# Altium integrated library Weidmueller_OMNIMATE_Signal.IntLib: 2550 symbols (part 5 of 45) (continued)
## 1037010000_Single (continued)

## 1037020000
designator J?
OMNIMATE Signal - series BC/SC 3.81; PartNumber: 1037020000; Manufacturer: Weidmueller; Short_text_for_material: SC-SMT 3.81/04/270F 3.2SN BK BX; Side_termination_characteristic: Flange; Mounting_onto_the_PCB: Reflow solder connection; Pitch_mm: 3.81 mm; Pitch_inch: 0.15 inch; No_of_poles: 4; Outgoing_elbow: 270°; Solder_pin_length_mm: 3.2 mm; Contact_material: Cu-Leg; Contact_surface: tinned; Insulating_material: LCP GF; UL_94_flammability_rating: V-0; Rated_voltage_for_surge_voltage_class_pollution_degree_II_2: 320 V; Rated_voltage_use_group_B_UL_1059: 300 V; Rated_current_use_group_B_UL_1059: 10 A; PackageReference: SC_SMT_3_81_270F_04; Colour: Black; Packaging: Box; Qty: 50 PCS; Revision: V1; ComponentLink1Description: Manufacturer URL; ComponentLink1URL: http://www.weidmueller.com/; ComponentLink2Description: URL Link1; ComponentLink2URL: http://catalog.weidmueller.com/catalog/Start.do?localeId=en&ObjectID=1037020000
footprint SC_SMT_3_81_270F_04 (OMNIMATE Signal - Serie BC/SC 3.81  SC-SMT 3.81/04/270F 3.2)
pins: A1, A2, A3, A4

## 1037020000_Single
designator J?
OMNIMATE Signal - series BC/SC 3.81; PartNumber: 1037020000; Manufacturer: Weidmueller; Short_text_for_material: SC-SMT 3.81/04/270F 3.2SN BK BX; Side_termination_characteristic: Flange; Mounting_onto_the_PCB: Reflow solder connection; Pitch_mm: 3.81 mm; Pitch_inch: 0.15 inch; No_of_poles: 4; Outgoing_elbow: 270°; Solder_pin_length_mm: 3.2 mm; Contact_material: Cu-Leg; Contact_surface: tinned; Insulating_material: LCP GF; UL_94_flammability_rating: V-0; Rated_voltage_for_surge_voltage_class_pollution_degree_II_2: 320 V; Rated_voltage_use_group_B_UL_1059: 300 V; Rated_current_use_group_B_UL_1059: 10 A; PackageReference: SC_SMT_3_81_270F_04; Colour: Black; Packaging: Box; Qty: 50 PCS; Revision: V1; ComponentLink1Description: Manufacturer URL; ComponentLink1URL: http://www.weidmueller.com/; ComponentLink2Description: URL Link1; ComponentLink2URL: http://catalog.weidmueller.com/catalog/Start.do?localeId=en&ObjectID=1037020000
footprint SC_SMT_3_81_270F_04 (OMNIMATE Signal - Serie BC/SC 3.81  SC-SMT 3.81/04/270F 3.2)
part A pins: A1
part B pins: A2
part C pins: A3
part D pins: A4

## 1037060000
designator J?
OMNIMATE Signal - series BC/SC 3.81; PartNumber: 1037060000; Manufacturer: Weidmueller; Short_text_for_material: SC-SMT 3.81/08/270F 3.2SN BK BX; Side_termination_characteristic: Flange; Mounting_onto_the_PCB: Reflow solder connection; Pitch_mm: 3.81 mm; Pitch_inch: 0.15 inch; No_of_poles: 8; Outgoing_elbow: 270°; Solder_pin_length_mm: 3.2 mm; Contact_material: Cu-Leg; Contact_surface: tinned; Insulating_material: LCP GF; UL_94_flammability_rating: V-0; Rated_voltage_for_surge_voltage_class_pollution_degree_II_2: 320 V; Rated_voltage_use_group_B_UL_1059: 300 V; Rated_current_use_group_B_UL_1059: 10 A; PackageReference: SC_SMT_3_81_270F_08; Colour: Black; Packaging: Box; Qty: 50 PCS; Revision: V1; ComponentLink1Description: Manufacturer URL; ComponentLink1URL: http://www.weidmueller.com/; ComponentLink2Description: URL Link1; ComponentLink2URL: http://catalog.weidmueller.com/catalog/Start.do?localeId=en&ObjectID=1037060000
footprint SC_SMT_3_81_270F_08 (OMNIMATE Signal - Serie BC/SC 3.81  SC-SMT 3.81/08/270F 3.2)
pins: A1, A2, A3, A4, A5, A6, A7, A8

## 1037060000_Single
designator J?
OMNIMATE Signal - series BC/SC 3.81; PartNumber: 1037060000; Manufacturer: Weidmueller; Short_text_for_material: SC-SMT 3.81/08/270F 3.2SN BK BX; Side_termination_characteristic: Flange; Mounting_onto_the_PCB: Reflow solder connection; Pitch_mm: 3.81 mm; Pitch_inch: 0.15 inch; No_of_poles: 8; Outgoing_elbow: 270°; Solder_pin_length_mm: 3.2 mm; Contact_material: Cu-Leg; Contact_surface: tinned; Insulating_material: LCP GF; UL_94_flammability_rating: V-0; Rated_voltage_for_surge_voltage_class_pollution_degree_II_2: 320 V; Rated_voltage_use_group_B_UL_1059: 300 V; Rated_current_use_group_B_UL_1059: 10 A; PackageReference: SC_SMT_3_81_270F_08; Colour: Black; Packaging: Box; Qty: 50 PCS; Revision: V1; ComponentLink1Description: Manufacturer URL; ComponentLink1URL: http://www.weidmueller.com/; ComponentLink2Description: URL Link1; ComponentLink2URL: http://catalog.weidmueller.com/catalog/Start.do?localeId=en&ObjectID=1037060000
footprint SC_SMT_3_81_270F_08 (OMNIMATE Signal - Serie BC/SC 3.81  SC-SMT 3.81/08/270F 3.2)
part A pins: A1
part B pins: A2
part C pins: A3
part D pins: A4
part E pins: A5
part F pins: A6
part G pins: A7
part H pins: A8

## 1037330000
designator J?
OMNIMATE Signal - series BC/SC 3.81; PartNumber: 1037330000; Manufacturer: Weidmueller; Short_text_for_material: SC-SMT 3.81/02/270F 1.5SN BK BX; Side_termination_characteristic: Flange; Mounting_onto_the_PCB: Reflow solder connection; Pitch_mm: 3.81 mm; Pitch_inch: 0.15 inch; No_of_poles: 2; Outgoing_elbow: 270°; Solder_pin_length_mm: 1.5 mm; Contact_surface: tinned; Insulating_material: LCP GF; UL_94_flammability_rating: V-0; Rated_voltage_for_surge_voltage_class_pollution_degree_II_2: 320 V; Rated_current_min_no_of_poles_TU_20_deg_C: 17.5 A; Rated_voltage_use_group_B_UL_1059: 300 V; Rated_current_use_group_B_UL_1059: 10 A; PackageReference: SC_SMT_3_81_270F_02; Colour: Black; Packaging: Box; Qty: 50 PCS; Revision: V1; ComponentLink1Description: Manufacturer URL; ComponentLink1URL: http://www.weidmueller.com/; ComponentLink2Description: URL Link1; ComponentLink2URL: http://catalog.weidmueller.com/catalog/Start.do?localeId=en&ObjectID=1037330000
footprint SC_SMT_3_81_270F_02 (OMNIMATE Signal - Serie BC/SC 3.81  SC-SMT 3.81/02/270F 3.2)
pins: A1, A2

## 1037330000_Single
designator J?
OMNIMATE Signal - series BC/SC 3.81; PartNumber: 1037330000; Manufacturer: Weidmueller; Short_text_for_material: SC-SMT 3.81/02/270F 1.5SN BK BX; Side_termination_characteristic: Flange; Mounting_onto_the_PCB: Reflow solder connection; Pitch_mm: 3.81 mm; Pitch_inch: 0.15 inch; No_of_poles: 2; Outgoing_elbow: 270°; Solder_pin_length_mm: 1.5 mm; Contact_surface: tinned; Insulating_material: LCP GF; UL_94_flammability_rating: V-0; Rated_voltage_for_surge_voltage_class_pollution_degree_II_2: 320 V; Rated_current_min_no_of_poles_TU_20_deg_C: 17.5 A; Rated_voltage_use_group_B_UL_1059: 300 V; Rated_current_use_group_B_UL_1059: 10 A; PackageReference: SC_SMT_3_81_270F_02; Colour: Black; Packaging: Box; Qty: 50 PCS; Revision: V1; ComponentLink1Description: Manufacturer URL; ComponentLink1URL: http://www.weidmueller.com/; ComponentLink2Description: URL Link1; ComponentLink2URL: http://catalog.weidmueller.com/catalog/Start.do?localeId=en&ObjectID=1037330000
footprint SC_SMT_3_81_270F_02 (OMNIMATE Signal - Serie BC/SC 3.81  SC-SMT 3.81/02/270F 3.2)
part A pins: A1
part B pins: A2

## 1037340000
designator J?
OMNIMATE Signal - series BC/SC 3.81; PartNumber: 1037340000; Manufacturer: Weidmueller; Short_text_for_material: SC-SMT 3.81/03/270F 1.5SN BK BX; Side_termination_characteristic: Flange; Mounting_onto_the_PCB: Reflow solder connection; Pitch_mm: 3.81 mm; Pitch_inch: 0.15 inch; No_of_poles: 3; Outgoing_elbow: 270°; Solder_pin_length_mm: 1.5 mm; Contact_surface: tinned; Insulating_material: LCP GF; UL_94_flammability_rating: V-0; Rated_voltage_for_surge_voltage_class_pollution_degree_II_2: 320 V; Rated_current_min_no_of_poles_TU_20_deg_C: 17.5 A; Rated_voltage_use_group_B_UL_1059: 300 V; Rated_current_use_group_B_UL_1059: 10 A; PackageReference: SC_SMT_3_81_270F_03; Colour: Black; Packaging: Box; Qty: 50 PCS; Revision: V1; ComponentLink1Description: Manufacturer URL; ComponentLink1URL: http://www.weidmueller.com/; ComponentLink2Description: URL Link1; ComponentLink2URL: http://catalog.weidmueller.com/catalog/Start.do?localeId=en&ObjectID=1037340000
footprint SC_SMT_3_81_270F_03 (OMNIMATE Signal - Serie BC/SC 3.81  SC-SMT 3.81/03/270F 3.2)
pins: A1, A2, A3

## 1037340000_Single
designator J?
OMNIMATE Signal - series BC/SC 3.81; PartNumber: 1037340000; Manufacturer: Weidmueller; Short_text_for_material: SC-SMT 3.81/03/270F 1.5SN BK BX; Side_termination_characteristic: Flange; Mounting_onto_the_PCB: Reflow solder connection; Pitch_mm: 3.81 mm; Pitch_inch: 0.15 inch; No_of_poles: 3; Outgoing_elbow: 270°; Solder_pin_length_mm: 1.5 mm; Contact_surface: tinned; Insulating_material: LCP GF; UL_94_flammability_rating: V-0; Rated_voltage_for_surge_voltage_class_pollution_degree_II_2: 320 V; Rated_current_min_no_of_poles_TU_20_deg_C: 17.5 A; Rated_voltage_use_group_B_UL_1059: 300 V; Rated_current_use_group_B_UL_1059: 10 A; PackageReference: SC_SMT_3_81_270F_03; Colour: Black; Packaging: Box; Qty: 50 PCS; Revision: V1; ComponentLink1Description: Manufacturer URL; ComponentLink1URL: http://www.weidmueller.com/; ComponentLink2Description: URL Link1; ComponentLink2URL: http://catalog.weidmueller.com/catalog/Start.do?localeId=en&ObjectID=1037340000
footprint SC_SMT_3_81_270F_03 (OMNIMATE Signal - Serie BC/SC 3.81  SC-SMT 3.81/03/270F 3.2)
part A pins: A1
part B pins: A2
part C pins: A3

## 1037350000
designator J?
OMNIMATE Signal - series BC/SC 3.81; PartNumber: 1037350000; Manufacturer: Weidmueller; Short_text_for_material: SC-SMT 3.81/04/270F 1.5SN BK BX; Side_termination_characteristic: Flange; Mounting_onto_the_PCB: Reflow solder connection; Pitch_mm: 3.81 mm; Pitch_inch: 0.15 inch; No_of_poles: 4; Outgoing_elbow: 270°; Solder_pin_length_mm: 1.5 mm; Contact_surface: tinned; Insulating_material: LCP GF; UL_94_flammability_rating: V-0; Rated_voltage_for_surge_voltage_class_pollution_degree_II_2: 320 V; Rated_current_min_no_of_poles_TU_20_deg_C: 17.5 A; Rated_voltage_use_group_B_UL_1059: 300 V; Rated_current_use_group_B_UL_1059: 10 A; PackageReference: SC_SMT_3_81_270F_04; Colour: Black; Packaging: Box; Qty: 50 PCS; Revision: V1; ComponentLink1Description: Manufacturer URL; ComponentLink1URL: http://www.weidmueller.com/; ComponentLink2Description: URL Link1; ComponentLink2URL: http://catalog.weidmueller.com/catalog/Start.do?localeId=en&ObjectID=1037350000
footprint SC_SMT_3_81_270F_04 (OMNIMATE Signal - Serie BC/SC 3.81  SC-SMT 3.81/04/270F 3.2)
pins: A1, A2, A3, A4

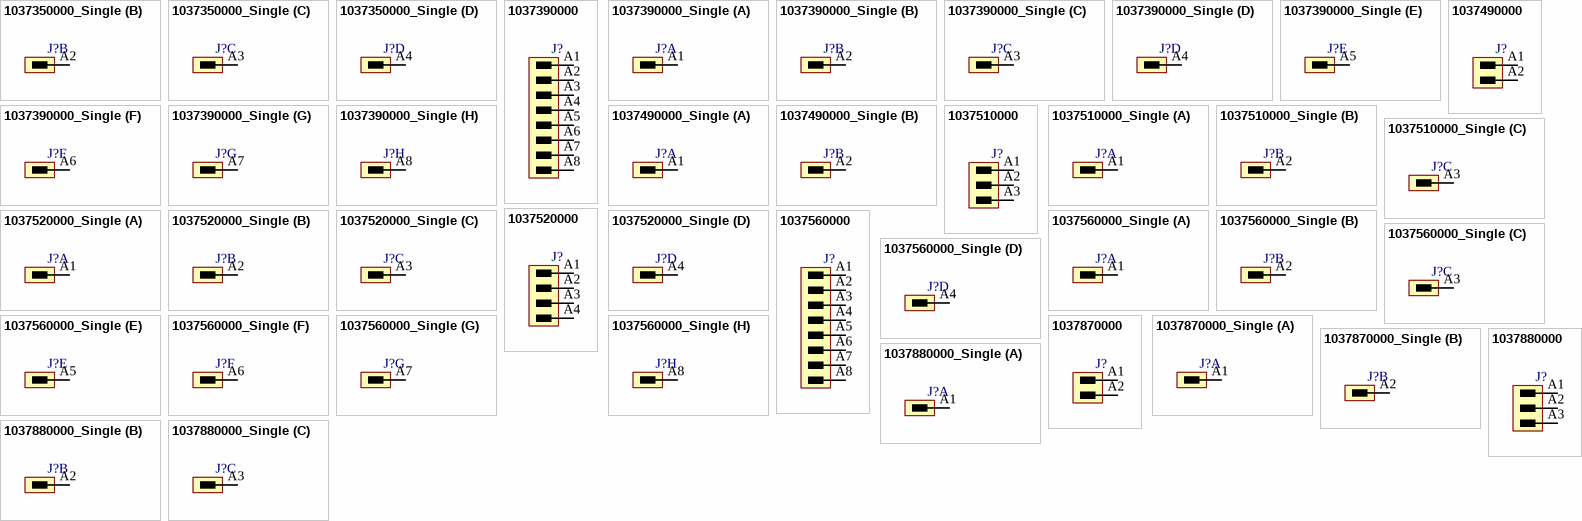
[diagram p30: symbols 1037350000_Single to 1037880000_Single]

## 1037350000_Single
designator J?
OMNIMATE Signal - series BC/SC 3.81; PartNumber: 1037350000; Manufacturer: Weidmueller; Short_text_for_material: SC-SMT 3.81/04/270F 1.5SN BK BX; Side_termination_characteristic: Flange; Mounting_onto_the_PCB: Reflow solder connection; Pitch_mm: 3.81 mm; Pitch_inch: 0.15 inch; No_of_poles: 4; Outgoing_elbow: 270°; Solder_pin_length_mm: 1.5 mm; Contact_surface: tinned; Insulating_material: LCP GF; UL_94_flammability_rating: V-0; Rated_voltage_for_surge_voltage_class_pollution_degree_II_2: 320 V; Rated_current_min_no_of_poles_TU_20_deg_C: 17.5 A; Rated_voltage_use_group_B_UL_1059: 300 V; Rated_current_use_group_B_UL_1059: 10 A; PackageReference: SC_SMT_3_81_270F_04; Colour: Black; Packaging: Box; Qty: 50 PCS; Revision: V1; ComponentLink1Description: Manufacturer URL; ComponentLink1URL: http://www.weidmueller.com/; ComponentLink2Description: URL Link1; ComponentLink2URL: http://catalog.weidmueller.com/catalog/Start.do?localeId=en&ObjectID=1037350000
footprint SC_SMT_3_81_270F_04 (OMNIMATE Signal - Serie BC/SC 3.81  SC-SMT 3.81/04/270F 3.2)
part A pins: A1
part B pins: A2
part C pins: A3
part D pins: A4

## 1037390000
designator J?
OMNIMATE Signal - series BC/SC 3.81; PartNumber: 1037390000; Manufacturer: Weidmueller; Short_text_for_material: SC-SMT 3.81/08/270F 1.5SN BK BX; Side_termination_characteristic: Flange; Mounting_onto_the_PCB: Reflow solder connection; Pitch_mm: 3.81 mm; Pitch_inch: 0.15 inch; No_of_poles: 8; Outgoing_elbow: 270°; Solder_pin_length_mm: 1.5 mm; Contact_surface: tinned; Insulating_material: LCP GF; UL_94_flammability_rating: V-0; Rated_voltage_for_surge_voltage_class_pollution_degree_II_2: 320 V; Rated_current_min_no_of_poles_TU_20_deg_C: 17.5 A; Rated_voltage_use_group_B_UL_1059: 300 V; Rated_current_use_group_B_UL_1059: 10 A; PackageReference: SC_SMT_3_81_270F_08; Colour: Black; Packaging: Box; Qty: 50 PCS; Revision: V1; ComponentLink1Description: Manufacturer URL; ComponentLink1URL: http://www.weidmueller.com/; ComponentLink2Description: URL Link1; ComponentLink2URL: http://catalog.weidmueller.com/catalog/Start.do?localeId=en&ObjectID=1037390000
footprint SC_SMT_3_81_270F_08 (OMNIMATE Signal - Serie BC/SC 3.81  SC-SMT 3.81/08/270F 3.2)
pins: A1, A2, A3, A4, A5, A6, A7, A8

## 1037390000_Single
designator J?
OMNIMATE Signal - series BC/SC 3.81; PartNumber: 1037390000; Manufacturer: Weidmueller; Short_text_for_material: SC-SMT 3.81/08/270F 1.5SN BK BX; Side_termination_characteristic: Flange; Mounting_onto_the_PCB: Reflow solder connection; Pitch_mm: 3.81 mm; Pitch_inch: 0.15 inch; No_of_poles: 8; Outgoing_elbow: 270°; Solder_pin_length_mm: 1.5 mm; Contact_surface: tinned; Insulating_material: LCP GF; UL_94_flammability_rating: V-0; Rated_voltage_for_surge_voltage_class_pollution_degree_II_2: 320 V; Rated_current_min_no_of_poles_TU_20_deg_C: 17.5 A; Rated_voltage_use_group_B_UL_1059: 300 V; Rated_current_use_group_B_UL_1059: 10 A; PackageReference: SC_SMT_3_81_270F_08; Colour: Black; Packaging: Box; Qty: 50 PCS; Revision: V1; ComponentLink1Description: Manufacturer URL; ComponentLink1URL: http://www.weidmueller.com/; ComponentLink2Description: URL Link1; ComponentLink2URL: http://catalog.weidmueller.com/catalog/Start.do?localeId=en&ObjectID=1037390000
footprint SC_SMT_3_81_270F_08 (OMNIMATE Signal - Serie BC/SC 3.81  SC-SMT 3.81/08/270F 3.2)
part A pins: A1
part B pins: A2
part C pins: A3
part D pins: A4
part E pins: A5
part F pins: A6
part G pins: A7
part H pins: A8

## 1037490000
designator J?
OMNIMATE Signal - series BC/SC 3.81; PartNumber: 1037490000; Manufacturer: Weidmueller; Short_text_for_material: SC 3.81/02/270G 3.2SN OR BX; Side_termination_characteristic: closed side; Mounting_onto_the_PCB: Solder connection; Pitch_mm: 3.81 mm; Pitch_inch: 0.15 inch; No_of_poles: 2; Outgoing_elbow: 270°; Solder_pin_length_mm: 3.2 mm; Contact_material: Cu-Leg; Contact_surface: tinned; Insulating_material: PA GF; UL_94_flammability_rating: V-0; Rated_voltage_for_surge_voltage_class_pollution_degree_II_2: 320 V; Rated_voltage_use_group_B_UL_1059: 300 V; Rated_current_use_group_B_UL_1059: 10 A; PackageReference: SC_3_81_270G_02; Colour: Orange; Packaging: Box; Qty: 50 PCS; Revision: V1; ComponentLink1Description: Manufacturer URL; ComponentLink1URL: http://www.weidmueller.com/; ComponentLink2Description: URL Link1; ComponentLink2URL: http://catalog.weidmueller.com/catalog/Start.do?localeId=en&ObjectID=1037490000
footprint SC_3_81_270G_02 (OMNIMATE Signal - Serie BC/SC 3.81  SC 3.81/02/270G 3.2)
pins: A1, A2

## 1037490000_Single
designator J?
OMNIMATE Signal - series BC/SC 3.81; PartNumber: 1037490000; Manufacturer: Weidmueller; Short_text_for_material: SC 3.81/02/270G 3.2SN OR BX; Side_termination_characteristic: closed side; Mounting_onto_the_PCB: Solder connection; Pitch_mm: 3.81 mm; Pitch_inch: 0.15 inch; No_of_poles: 2; Outgoing_elbow: 270°; Solder_pin_length_mm: 3.2 mm; Contact_material: Cu-Leg; Contact_surface: tinned; Insulating_material: PA GF; UL_94_flammability_rating: V-0; Rated_voltage_for_surge_voltage_class_pollution_degree_II_2: 320 V; Rated_voltage_use_group_B_UL_1059: 300 V; Rated_current_use_group_B_UL_1059: 10 A; PackageReference: SC_3_81_270G_02; Colour: Orange; Packaging: Box; Qty: 50 PCS; Revision: V1; ComponentLink1Description: Manufacturer URL; ComponentLink1URL: http://www.weidmueller.com/; ComponentLink2Description: URL Link1; ComponentLink2URL: http://catalog.weidmueller.com/catalog/Start.do?localeId=en&ObjectID=1037490000
footprint SC_3_81_270G_02 (OMNIMATE Signal - Serie BC/SC 3.81  SC 3.81/02/270G 3.2)
part A pins: A1
part B pins: A2

## 1037510000
designator J?
OMNIMATE Signal - series BC/SC 3.81; PartNumber: 1037510000; Manufacturer: Weidmueller; Short_text_for_material: SC 3.81/03/270G 3.2SN OR BX; Side_termination_characteristic: closed side; Mounting_onto_the_PCB: Solder connection; Pitch_mm: 3.81 mm; Pitch_inch: 0.15 inch; No_of_poles: 3; Outgoing_elbow: 270°; Solder_pin_length_mm: 3.2 mm; Contact_material: Cu-Leg; Contact_surface: tinned; Insulating_material: PA GF; UL_94_flammability_rating: V-0; Rated_voltage_for_surge_voltage_class_pollution_degree_II_2: 320 V; Rated_voltage_use_group_B_UL_1059: 300 V; Rated_current_use_group_B_UL_1059: 10 A; PackageReference: SC_3_81_270G_03; Colour: Orange; Packaging: Box; Qty: 50 PCS; Revision: V1; ComponentLink1Description: Manufacturer URL; ComponentLink1URL: http://www.weidmueller.com/; ComponentLink2Description: URL Link1; ComponentLink2URL: http://catalog.weidmueller.com/catalog/Start.do?localeId=en&ObjectID=1037510000
footprint SC_3_81_270G_03 (OMNIMATE Signal - Serie BC/SC 3.81  SC 3.81/03/270G 3.2)
pins: A1, A2, A3

## 1037510000_Single
designator J?
OMNIMATE Signal - series BC/SC 3.81; PartNumber: 1037510000; Manufacturer: Weidmueller; Short_text_for_material: SC 3.81/03/270G 3.2SN OR BX; Side_termination_characteristic: closed side; Mounting_onto_the_PCB: Solder connection; Pitch_mm: 3.81 mm; Pitch_inch: 0.15 inch; No_of_poles: 3; Outgoing_elbow: 270°; Solder_pin_length_mm: 3.2 mm; Contact_material: Cu-Leg; Contact_surface: tinned; Insulating_material: PA GF; UL_94_flammability_rating: V-0; Rated_voltage_for_surge_voltage_class_pollution_degree_II_2: 320 V; Rated_voltage_use_group_B_UL_1059: 300 V; Rated_current_use_group_B_UL_1059: 10 A; PackageReference: SC_3_81_270G_03; Colour: Orange; Packaging: Box; Qty: 50 PCS; Revision: V1; ComponentLink1Description: Manufacturer URL; ComponentLink1URL: http://www.weidmueller.com/; ComponentLink2Description: URL Link1; ComponentLink2URL: http://catalog.weidmueller.com/catalog/Start.do?localeId=en&ObjectID=1037510000
footprint SC_3_81_270G_03 (OMNIMATE Signal - Serie BC/SC 3.81  SC 3.81/03/270G 3.2)
part A pins: A1
part B pins: A2
part C pins: A3

## 1037520000
designator J?
OMNIMATE Signal - series BC/SC 3.81; PartNumber: 1037520000; Manufacturer: Weidmueller; Short_text_for_material: SC 3.81/04/270G 3.2SN OR BX; Side_termination_characteristic: closed side; Mounting_onto_the_PCB: Solder connection; Pitch_mm: 3.81 mm; Pitch_inch: 0.15 inch; No_of_poles: 4; Outgoing_elbow: 270°; Solder_pin_length_mm: 3.2 mm; Contact_material: Cu-Leg; Contact_surface: tinned; Insulating_material: PA GF; UL_94_flammability_rating: V-0; Rated_voltage_for_surge_voltage_class_pollution_degree_II_2: 320 V; Rated_voltage_use_group_B_UL_1059: 300 V; Rated_current_use_group_B_UL_1059: 10 A; PackageReference: SC_3_81_270G_04; Colour: Orange; Packaging: Box; Qty: 50 PCS; Revision: V1; ComponentLink1Description: Manufacturer URL; ComponentLink1URL: http://www.weidmueller.com/; ComponentLink2Description: URL Link1; ComponentLink2URL: http://catalog.weidmueller.com/catalog/Start.do?localeId=en&ObjectID=1037520000
footprint SC_3_81_270G_04 (OMNIMATE Signal - Serie BC/SC 3.81  SC 3.81/04/270G 3.2)
pins: A1, A2, A3, A4

## 1037520000_Single
designator J?
OMNIMATE Signal - series BC/SC 3.81; PartNumber: 1037520000; Manufacturer: Weidmueller; Short_text_for_material: SC 3.81/04/270G 3.2SN OR BX; Side_termination_characteristic: closed side; Mounting_onto_the_PCB: Solder connection; Pitch_mm: 3.81 mm; Pitch_inch: 0.15 inch; No_of_poles: 4; Outgoing_elbow: 270°; Solder_pin_length_mm: 3.2 mm; Contact_material: Cu-Leg; Contact_surface: tinned; Insulating_material: PA GF; UL_94_flammability_rating: V-0; Rated_voltage_for_surge_voltage_class_pollution_degree_II_2: 320 V; Rated_voltage_use_group_B_UL_1059: 300 V; Rated_current_use_group_B_UL_1059: 10 A; PackageReference: SC_3_81_270G_04; Colour: Orange; Packaging: Box; Qty: 50 PCS; Revision: V1; ComponentLink1Description: Manufacturer URL; ComponentLink1URL: http://www.weidmueller.com/; ComponentLink2Description: URL Link1; ComponentLink2URL: http://catalog.weidmueller.com/catalog/Start.do?localeId=en&ObjectID=1037520000
footprint SC_3_81_270G_04 (OMNIMATE Signal - Serie BC/SC 3.81  SC 3.81/04/270G 3.2)
part A pins: A1
part B pins: A2
part C pins: A3
part D pins: A4

## 1037560000
designator J?
OMNIMATE Signal - series BC/SC 3.81; PartNumber: 1037560000; Manufacturer: Weidmueller; Short_text_for_material: SC 3.81/08/270G 3.2SN OR BX; Side_termination_characteristic: closed side; Mounting_onto_the_PCB: Solder connection; Pitch_mm: 3.81 mm; Pitch_inch: 0.15 inch; No_of_poles: 8; Outgoing_elbow: 270°; Solder_pin_length_mm: 3.2 mm; Contact_material: Cu-Leg; Contact_surface: tinned; Insulating_material: PA GF; UL_94_flammability_rating: V-0; Rated_voltage_for_surge_voltage_class_pollution_degree_II_2: 320 V; Rated_voltage_use_group_B_UL_1059: 300 V; Rated_current_use_group_B_UL_1059: 10 A; PackageReference: SC_3_81_270G_08; Colour: Orange; Packaging: Box; Qty: 50 PCS; Revision: V1; ComponentLink1Description: Manufacturer URL; ComponentLink1URL: http://www.weidmueller.com/; ComponentLink2Description: URL Link1; ComponentLink2URL: http://catalog.weidmueller.com/catalog/Start.do?localeId=en&ObjectID=1037560000
footprint SC_3_81_270G_08 (OMNIMATE Signal - Serie BC/SC 3.81  SC 3.81/08/270G 3.2)
pins: A1, A2, A3, A4, A5, A6, A7, A8

## 1037560000_Single
designator J?
OMNIMATE Signal - series BC/SC 3.81; PartNumber: 1037560000; Manufacturer: Weidmueller; Short_text_for_material: SC 3.81/08/270G 3.2SN OR BX; Side_termination_characteristic: closed side; Mounting_onto_the_PCB: Solder connection; Pitch_mm: 3.81 mm; Pitch_inch: 0.15 inch; No_of_poles: 8; Outgoing_elbow: 270°; Solder_pin_length_mm: 3.2 mm; Contact_material: Cu-Leg; Contact_surface: tinned; Insulating_material: PA GF; UL_94_flammability_rating: V-0; Rated_voltage_for_surge_voltage_class_pollution_degree_II_2: 320 V; Rated_voltage_use_group_B_UL_1059: 300 V; Rated_current_use_group_B_UL_1059: 10 A; PackageReference: SC_3_81_270G_08; Colour: Orange; Packaging: Box; Qty: 50 PCS; Revision: V1; ComponentLink1Description: Manufacturer URL; ComponentLink1URL: http://www.weidmueller.com/; ComponentLink2Description: URL Link1; ComponentLink2URL: http://catalog.weidmueller.com/catalog/Start.do?localeId=en&ObjectID=1037560000
footprint SC_3_81_270G_08 (OMNIMATE Signal - Serie BC/SC 3.81  SC 3.81/08/270G 3.2)
part A pins: A1
part B pins: A2
part C pins: A3
part D pins: A4
part E pins: A5
part F pins: A6
part G pins: A7
part H pins: A8

## 1037870000
designator J?
OMNIMATE Signal - series BC/SC 3.81; PartNumber: 1037870000; Manufacturer: Weidmueller; Short_text_for_material: SC 3.81/02/270G 3.2SN BK BX; Side_termination_characteristic: closed side; Mounting_onto_the_PCB: Solder connection; Pitch_mm: 3.81 mm; Pitch_inch: 0.15 inch; No_of_poles: 2; Outgoing_elbow: 270°; Solder_pin_length_mm: 3.2 mm; Contact_surface: tinned; Insulating_material: PA GF; UL_94_flammability_rating: V-0; Rated_voltage_for_surge_voltage_class_pollution_degree_II_2: 320 V; Rated_current_min_no_of_poles_TU_20_deg_C: 17.5 A; Rated_voltage_use_group_B_UL_1059: 300 V; Rated_current_use_group_B_UL_1059: 10 A; PackageReference: SC_3_81_270G_02; Colour: Black; Packaging: Box; Qty: 50 PCS; Revision: V1; ComponentLink1Description: Manufacturer URL; ComponentLink1URL: http://www.weidmueller.com/; ComponentLink2Description: URL Link1; ComponentLink2URL: http://catalog.weidmueller.com/catalog/Start.do?localeId=en&ObjectID=1037870000
footprint SC_3_81_270G_02 (OMNIMATE Signal - Serie BC/SC 3.81  SC 3.81/02/270G 3.2)
pins: A1, A2

## 1037870000_Single
designator J?
OMNIMATE Signal - series BC/SC 3.81; PartNumber: 1037870000; Manufacturer: Weidmueller; Short_text_for_material: SC 3.81/02/270G 3.2SN BK BX; Side_termination_characteristic: closed side; Mounting_onto_the_PCB: Solder connection; Pitch_mm: 3.81 mm; Pitch_inch: 0.15 inch; No_of_poles: 2; Outgoing_elbow: 270°; Solder_pin_length_mm: 3.2 mm; Contact_surface: tinned; Insulating_material: PA GF; UL_94_flammability_rating: V-0; Rated_voltage_for_surge_voltage_class_pollution_degree_II_2: 320 V; Rated_current_min_no_of_poles_TU_20_deg_C: 17.5 A; Rated_voltage_use_group_B_UL_1059: 300 V; Rated_current_use_group_B_UL_1059: 10 A; PackageReference: SC_3_81_270G_02; Colour: Black; Packaging: Box; Qty: 50 PCS; Revision: V1; ComponentLink1Description: Manufacturer URL; ComponentLink1URL: http://www.weidmueller.com/; ComponentLink2Description: URL Link1; ComponentLink2URL: http://catalog.weidmueller.com/catalog/Start.do?localeId=en&ObjectID=1037870000
footprint SC_3_81_270G_02 (OMNIMATE Signal - Serie BC/SC 3.81  SC 3.81/02/270G 3.2)
part A pins: A1
part B pins: A2

## 1037880000
designator J?
OMNIMATE Signal - series BC/SC 3.81; PartNumber: 1037880000; Manufacturer: Weidmueller; Short_text_for_material: SC 3.81/03/270G 3.2SN BK BX; Side_termination_characteristic: closed side; Mounting_onto_the_PCB: Solder connection; Pitch_mm: 3.81 mm; Pitch_inch: 0.15 inch; No_of_poles: 3; Outgoing_elbow: 270°; Solder_pin_length_mm: 3.2 mm; Contact_surface: tinned; Insulating_material: PA GF; UL_94_flammability_rating: V-0; Rated_voltage_for_surge_voltage_class_pollution_degree_II_2: 320 V; Rated_current_min_no_of_poles_TU_20_deg_C: 17.5 A; Rated_voltage_use_group_B_UL_1059: 300 V; Rated_current_use_group_B_UL_1059: 10 A; PackageReference: SC_3_81_270G_03; Colour: Black; Packaging: Box; Qty: 50 PCS; Revision: V1; ComponentLink1Description: Manufacturer URL; ComponentLink1URL: http://www.weidmueller.com/; ComponentLink2Description: URL Link1; ComponentLink2URL: http://catalog.weidmueller.com/catalog/Start.do?localeId=en&ObjectID=1037880000
footprint SC_3_81_270G_03 (OMNIMATE Signal - Serie BC/SC 3.81  SC 3.81/03/270G 3.2)
pins: A1, A2, A3

## 1037880000_Single
designator J?
OMNIMATE Signal - series BC/SC 3.81; PartNumber: 1037880000; Manufacturer: Weidmueller; Short_text_for_material: SC 3.81/03/270G 3.2SN BK BX; Side_termination_characteristic: closed side; Mounting_onto_the_PCB: Solder connection; Pitch_mm: 3.81 mm; Pitch_inch: 0.15 inch; No_of_poles: 3; Outgoing_elbow: 270°; Solder_pin_length_mm: 3.2 mm; Contact_surface: tinned; Insulating_material: PA GF; UL_94_flammability_rating: V-0; Rated_voltage_for_surge_voltage_class_pollution_degree_II_2: 320 V; Rated_current_min_no_of_poles_TU_20_deg_C: 17.5 A; Rated_voltage_use_group_B_UL_1059: 300 V; Rated_current_use_group_B_UL_1059: 10 A; PackageReference: SC_3_81_270G_03; Colour: Black; Packaging: Box; Qty: 50 PCS; Revision: V1; ComponentLink1Description: Manufacturer URL; ComponentLink1URL: http://www.weidmueller.com/; ComponentLink2Description: URL Link1; ComponentLink2URL: http://catalog.weidmueller.com/catalog/Start.do?localeId=en&ObjectID=1037880000
footprint SC_3_81_270G_03 (OMNIMATE Signal - Serie BC/SC 3.81  SC 3.81/03/270G 3.2)
part A pins: A1
part B pins: A2
part C pins: A3

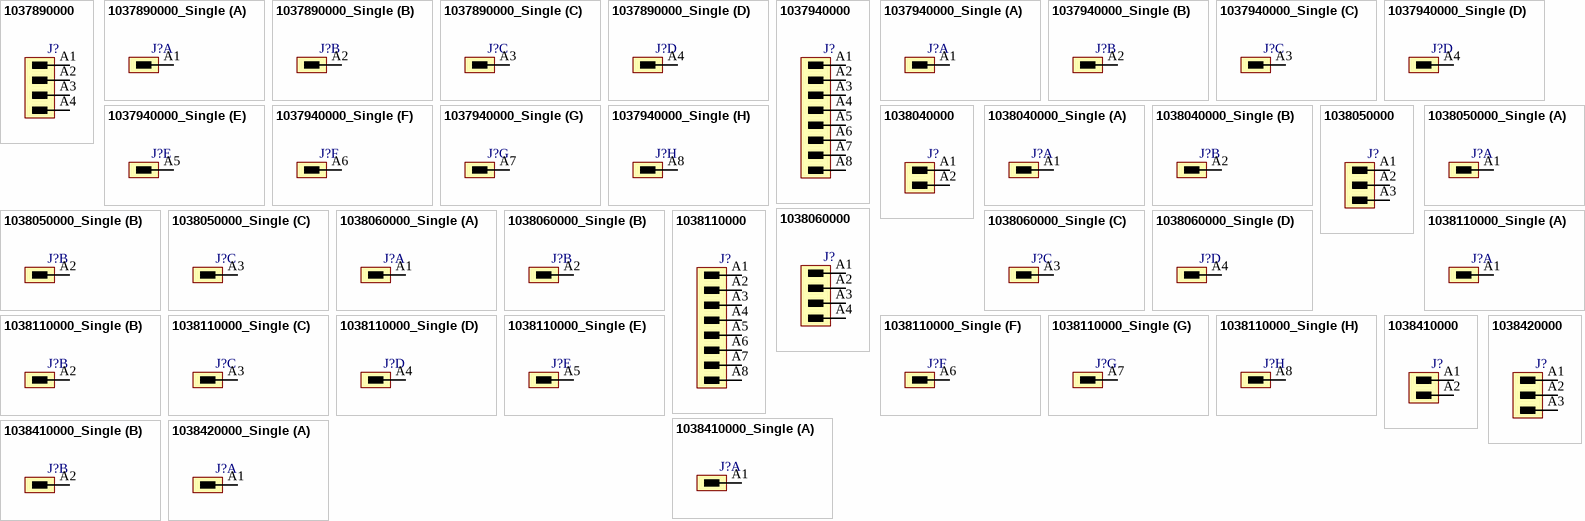
[diagram p31: symbols 1037890000 to 1038420000_Single]

## 1037890000
designator J?
OMNIMATE Signal - series BC/SC 3.81; PartNumber: 1037890000; Manufacturer: Weidmueller; Short_text_for_material: SC 3.81/04/270G 3.2SN BK BX; Side_termination_characteristic: closed side; Mounting_onto_the_PCB: Solder connection; Pitch_mm: 3.81 mm; Pitch_inch: 0.15 inch; No_of_poles: 4; Outgoing_elbow: 270°; Solder_pin_length_mm: 3.2 mm; Contact_surface: tinned; Insulating_material: PA GF; UL_94_flammability_rating: V-0; Rated_voltage_for_surge_voltage_class_pollution_degree_II_2: 320 V; Rated_current_min_no_of_poles_TU_20_deg_C: 17.5 A; Rated_voltage_use_group_B_UL_1059: 300 V; Rated_current_use_group_B_UL_1059: 10 A; PackageReference: SC_3_81_270G_04; Colour: Black; Packaging: Box; Qty: 50 PCS; Revision: V1; ComponentLink1Description: Manufacturer URL; ComponentLink1URL: http://www.weidmueller.com/; ComponentLink2Description: URL Link1; ComponentLink2URL: http://catalog.weidmueller.com/catalog/Start.do?localeId=en&ObjectID=1037890000
footprint SC_3_81_270G_04 (OMNIMATE Signal - Serie BC/SC 3.81  SC 3.81/04/270G 3.2)
pins: A1, A2, A3, A4

## 1037890000_Single
designator J?
OMNIMATE Signal - series BC/SC 3.81; PartNumber: 1037890000; Manufacturer: Weidmueller; Short_text_for_material: SC 3.81/04/270G 3.2SN BK BX; Side_termination_characteristic: closed side; Mounting_onto_the_PCB: Solder connection; Pitch_mm: 3.81 mm; Pitch_inch: 0.15 inch; No_of_poles: 4; Outgoing_elbow: 270°; Solder_pin_length_mm: 3.2 mm; Contact_surface: tinned; Insulating_material: PA GF; UL_94_flammability_rating: V-0; Rated_voltage_for_surge_voltage_class_pollution_degree_II_2: 320 V; Rated_current_min_no_of_poles_TU_20_deg_C: 17.5 A; Rated_voltage_use_group_B_UL_1059: 300 V; Rated_current_use_group_B_UL_1059: 10 A; PackageReference: SC_3_81_270G_04; Colour: Black; Packaging: Box; Qty: 50 PCS; Revision: V1; ComponentLink1Description: Manufacturer URL; ComponentLink1URL: http://www.weidmueller.com/; ComponentLink2Description: URL Link1; ComponentLink2URL: http://catalog.weidmueller.com/catalog/Start.do?localeId=en&ObjectID=1037890000
footprint SC_3_81_270G_04 (OMNIMATE Signal - Serie BC/SC 3.81  SC 3.81/04/270G 3.2)
part A pins: A1
part B pins: A2
part C pins: A3
part D pins: A4

## 1037940000
designator J?
OMNIMATE Signal - series BC/SC 3.81; PartNumber: 1037940000; Manufacturer: Weidmueller; Short_text_for_material: SC 3.81/08/270G 3.2SN BK BX; Side_termination_characteristic: closed side; Mounting_onto_the_PCB: Solder connection; Pitch_mm: 3.81 mm; Pitch_inch: 0.15 inch; No_of_poles: 8; Outgoing_elbow: 270°; Solder_pin_length_mm: 3.2 mm; Contact_surface: tinned; Insulating_material: PA GF; UL_94_flammability_rating: V-0; Rated_voltage_for_surge_voltage_class_pollution_degree_II_2: 320 V; Rated_current_min_no_of_poles_TU_20_deg_C: 17.5 A; Rated_voltage_use_group_B_UL_1059: 300 V; Rated_current_use_group_B_UL_1059: 10 A; PackageReference: SC_3_81_270G_08; Colour: Black; Packaging: Box; Qty: 50 PCS; Revision: V1; ComponentLink1Description: Manufacturer URL; ComponentLink1URL: http://www.weidmueller.com/; ComponentLink2Description: URL Link1; ComponentLink2URL: http://catalog.weidmueller.com/catalog/Start.do?localeId=en&ObjectID=1037940000
footprint SC_3_81_270G_08 (OMNIMATE Signal - Serie BC/SC 3.81  SC 3.81/08/270G 3.2)
pins: A1, A2, A3, A4, A5, A6, A7, A8

## 1037940000_Single
designator J?
OMNIMATE Signal - series BC/SC 3.81; PartNumber: 1037940000; Manufacturer: Weidmueller; Short_text_for_material: SC 3.81/08/270G 3.2SN BK BX; Side_termination_characteristic: closed side; Mounting_onto_the_PCB: Solder connection; Pitch_mm: 3.81 mm; Pitch_inch: 0.15 inch; No_of_poles: 8; Outgoing_elbow: 270°; Solder_pin_length_mm: 3.2 mm; Contact_surface: tinned; Insulating_material: PA GF; UL_94_flammability_rating: V-0; Rated_voltage_for_surge_voltage_class_pollution_degree_II_2: 320 V; Rated_current_min_no_of_poles_TU_20_deg_C: 17.5 A; Rated_voltage_use_group_B_UL_1059: 300 V; Rated_current_use_group_B_UL_1059: 10 A; PackageReference: SC_3_81_270G_08; Colour: Black; Packaging: Box; Qty: 50 PCS; Revision: V1; ComponentLink1Description: Manufacturer URL; ComponentLink1URL: http://www.weidmueller.com/; ComponentLink2Description: URL Link1; ComponentLink2URL: http://catalog.weidmueller.com/catalog/Start.do?localeId=en&ObjectID=1037940000
footprint SC_3_81_270G_08 (OMNIMATE Signal - Serie BC/SC 3.81  SC 3.81/08/270G 3.2)
part A pins: A1
part B pins: A2
part C pins: A3
part D pins: A4
part E pins: A5
part F pins: A6
part G pins: A7
part H pins: A8

## 1038040000
designator J?
OMNIMATE Signal - series BC/SC 3.81; PartNumber: 1038040000; Manufacturer: Weidmueller; Short_text_for_material: SC 3.81/02/270F 3.2SN OR BX; Side_termination_characteristic: Flange; Mounting_onto_the_PCB: Solder connection; Pitch_mm: 3.81 mm; Pitch_inch: 0.15 inch; No_of_poles: 2; Outgoing_elbow: 270°; Solder_pin_length_mm: 3.2 mm; Contact_material: Cu-Leg; Contact_surface: tinned; Insulating_material: PA GF; UL_94_flammability_rating: V-0; Rated_voltage_for_surge_voltage_class_pollution_degree_II_2: 320 V; Rated_voltage_use_group_B_UL_1059: 300 V; Rated_current_use_group_B_UL_1059: 10 A; PackageReference: SC_3_81_270F_02; Colour: Orange; Packaging: Box; Qty: 50 PCS; Revision: V1; ComponentLink1Description: Manufacturer URL; ComponentLink1URL: http://www.weidmueller.com/; ComponentLink2Description: URL Link1; ComponentLink2URL: http://catalog.weidmueller.com/catalog/Start.do?localeId=en&ObjectID=1038040000
footprint SC_3_81_270F_02 (OMNIMATE Signal - Serie BC/SC 3.81  SC 3.81/02/270F 3.2)
pins: A1, A2

## 1038040000_Single
designator J?
OMNIMATE Signal - series BC/SC 3.81; PartNumber: 1038040000; Manufacturer: Weidmueller; Short_text_for_material: SC 3.81/02/270F 3.2SN OR BX; Side_termination_characteristic: Flange; Mounting_onto_the_PCB: Solder connection; Pitch_mm: 3.81 mm; Pitch_inch: 0.15 inch; No_of_poles: 2; Outgoing_elbow: 270°; Solder_pin_length_mm: 3.2 mm; Contact_material: Cu-Leg; Contact_surface: tinned; Insulating_material: PA GF; UL_94_flammability_rating: V-0; Rated_voltage_for_surge_voltage_class_pollution_degree_II_2: 320 V; Rated_voltage_use_group_B_UL_1059: 300 V; Rated_current_use_group_B_UL_1059: 10 A; PackageReference: SC_3_81_270F_02; Colour: Orange; Packaging: Box; Qty: 50 PCS; Revision: V1; ComponentLink1Description: Manufacturer URL; ComponentLink1URL: http://www.weidmueller.com/; ComponentLink2Description: URL Link1; ComponentLink2URL: http://catalog.weidmueller.com/catalog/Start.do?localeId=en&ObjectID=1038040000
footprint SC_3_81_270F_02 (OMNIMATE Signal - Serie BC/SC 3.81  SC 3.81/02/270F 3.2)
part A pins: A1
part B pins: A2

## 1038050000
designator J?
OMNIMATE Signal - series BC/SC 3.81; PartNumber: 1038050000; Manufacturer: Weidmueller; Short_text_for_material: SC 3.81/03/270F 3.2SN OR BX; Side_termination_characteristic: Flange; Mounting_onto_the_PCB: Solder connection; Pitch_mm: 3.81 mm; Pitch_inch: 0.15 inch; No_of_poles: 3; Outgoing_elbow: 270°; Solder_pin_length_mm: 3.2 mm; Contact_material: Cu-Leg; Contact_surface: tinned; Insulating_material: PA GF; UL_94_flammability_rating: V-0; Rated_voltage_for_surge_voltage_class_pollution_degree_II_2: 320 V; Rated_voltage_use_group_B_UL_1059: 300 V; Rated_current_use_group_B_UL_1059: 10 A; PackageReference: SC_3_81_270F_03; Colour: Orange; Packaging: Box; Qty: 50 PCS; Revision: V1; ComponentLink1Description: Manufacturer URL; ComponentLink1URL: http://www.weidmueller.com/; ComponentLink2Description: URL Link1; ComponentLink2URL: http://catalog.weidmueller.com/catalog/Start.do?localeId=en&ObjectID=1038050000
footprint SC_3_81_270F_03 (OMNIMATE Signal - Serie BC/SC 3.81  SC 3.81/03/270F 3.2)
pins: A1, A2, A3

## 1038050000_Single
designator J?
OMNIMATE Signal - series BC/SC 3.81; PartNumber: 1038050000; Manufacturer: Weidmueller; Short_text_for_material: SC 3.81/03/270F 3.2SN OR BX; Side_termination_characteristic: Flange; Mounting_onto_the_PCB: Solder connection; Pitch_mm: 3.81 mm; Pitch_inch: 0.15 inch; No_of_poles: 3; Outgoing_elbow: 270°; Solder_pin_length_mm: 3.2 mm; Contact_material: Cu-Leg; Contact_surface: tinned; Insulating_material: PA GF; UL_94_flammability_rating: V-0; Rated_voltage_for_surge_voltage_class_pollution_degree_II_2: 320 V; Rated_voltage_use_group_B_UL_1059: 300 V; Rated_current_use_group_B_UL_1059: 10 A; PackageReference: SC_3_81_270F_03; Colour: Orange; Packaging: Box; Qty: 50 PCS; Revision: V1; ComponentLink1Description: Manufacturer URL; ComponentLink1URL: http://www.weidmueller.com/; ComponentLink2Description: URL Link1; ComponentLink2URL: http://catalog.weidmueller.com/catalog/Start.do?localeId=en&ObjectID=1038050000
footprint SC_3_81_270F_03 (OMNIMATE Signal - Serie BC/SC 3.81  SC 3.81/03/270F 3.2)
part A pins: A1
part B pins: A2
part C pins: A3

## 1038060000
designator J?
OMNIMATE Signal - series BC/SC 3.81; PartNumber: 1038060000; Manufacturer: Weidmueller; Short_text_for_material: SC 3.81/04/270F 3.2SN OR BX; Side_termination_characteristic: Flange; Mounting_onto_the_PCB: Solder connection; Pitch_mm: 3.81 mm; Pitch_inch: 0.15 inch; No_of_poles: 4; Outgoing_elbow: 270°; Solder_pin_length_mm: 3.2 mm; Contact_material: Cu-Leg; Contact_surface: tinned; Insulating_material: PA GF; UL_94_flammability_rating: V-0; Rated_voltage_for_surge_voltage_class_pollution_degree_II_2: 320 V; Rated_voltage_use_group_B_UL_1059: 300 V; Rated_current_use_group_B_UL_1059: 10 A; PackageReference: SC_3_81_270F_04; Colour: Orange; Packaging: Box; Qty: 50 PCS; Revision: V1; ComponentLink1Description: Manufacturer URL; ComponentLink1URL: http://www.weidmueller.com/; ComponentLink2Description: URL Link1; ComponentLink2URL: http://catalog.weidmueller.com/catalog/Start.do?localeId=en&ObjectID=1038060000
footprint SC_3_81_270F_04 (OMNIMATE Signal - Serie BC/SC 3.81  SC 3.81/04/270F 3.2)
pins: A1, A2, A3, A4